# Altium footprint library 3.22-杂项.PcbLib: 199 footprints (part 13 of 15)
Each footprint in its own frame and in the unit in brackets; x right, y up, seen from the top. Pads: shape width x height; smd on the part's side, far side on the other; paste and mask are expansions set on the pad; w line width, h text height; cw(c..) or ccw(c..) is an arc to the next point about the centre after c.
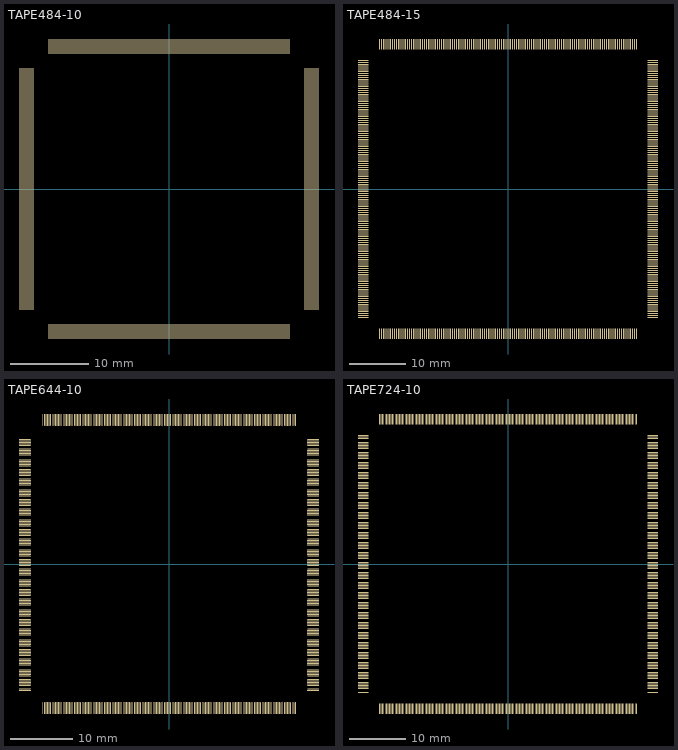
[diagram p12: the footprints below, top view; thin cyan lines are the x and y axes]

## TAPE484-10 [mil] "[ PCBѧϰȺ514746572 ]"
pads (484):
  oval 75x5 smd: 1(-712.5,599.5) 2(-712.5,589.5) 3(-712.5,579.5) 4(-712.5,569.5) 5(-712.5,559.5) 6(-712.5,549.5) 7(-712.5,539.5) 8(-712.5,529.5) 9(-712.5,519.5) 10(-712.5,509.5) 11(-712.5,499.5) 12(-712.5,489.5) 13(-712.5,479.5) 14(-712.5,469.5) 15(-712.5,459.5) 16(-712.5,449.5) 17(-712.5,439.5) 18(-712.5,429.5) 19(-712.5,419.5) 20(-712.5,409.5) 21(-712.5,399.5) 22(-712.5,389.5) 23(-712.5,379.5) 24(-712.5,369.5) 25(-712.5,359.5) 26(-712.5,349.5) 27(-712.5,339.5) 28(-712.5,329.5) 29(-712.5,319.5) 30(-712.5,309.5) 31(-712.5,299.5) 32(-712.5,289.5) 33(-712.5,279.5) 34(-712.5,269.5) 35(-712.5,259.5) 36(-712.5,249.5) 37(-712.5,239.5) 38(-712.5,229.5) 39(-712.5,219.5) 40(-712.5,209.5) 41(-712.5,199.5) 42(-712.5,189.5) 43(-712.5,179.5) 44(-712.5,169.5) 45(-712.5,159.5) 46(-712.5,149.5) 47(-712.5,139.5) 48(-712.5,129.5) 49(-712.5,119.5) 50(-712.5,109.5) 51(-712.5,99.5) 52(-712.5,89.5) 53(-712.5,79.5) 54(-712.5,69.5) 55(-712.5,59.5) 56(-712.5,49.5) 57(-712.5,39.5) 58(-712.5,29.5) 59(-712.5,19.5) 60(-712.5,9.5) 61(-712.5,-0.5) 62(-712.5,-10.5) 63(-712.5,-20.5) 64(-712.5,-30.5) 65(-712.5,-40.5) 66(-712.5,-50.5) 67(-712.5,-60.5) 68(-712.5,-70.5) 69(-712.5,-80.5) 70(-712.5,-90.5) 71(-712.5,-100.5) 72(-712.5,-110.5) 73(-712.5,-120.5) 74(-712.5,-130.5) 75(-712.5,-140.5) 76(-712.5,-150.5) 77(-712.5,-160.5) 78(-712.5,-170.5) 79(-712.5,-180.5) 80(-712.5,-190.5) 81(-712.5,-200.5) 82(-712.5,-210.5) 83(-712.5,-220.5) 84(-712.5,-230.5) 85(-712.5,-240.5) 86(-712.5,-250.5) 87(-712.5,-260.5) 88(-712.5,-270.5) 89(-712.5,-280.5) 90(-712.5,-290.5) 91(-712.5,-300.5) 92(-712.5,-310.5) 93(-712.5,-320.5) 94(-712.5,-330.5) 95(-712.5,-340.5) 96(-712.5,-350.5) 97(-712.5,-360.5) 98(-712.5,-370.5) 99(-712.5,-380.5) 100(-712.5,-390.5) 101(-712.5,-400.5) 102(-712.5,-410.5) 103(-712.5,-420.5) 104(-712.5,-430.5) 105(-712.5,-440.5) 106(-712.5,-450.5) 107(-712.5,-460.5) 108(-712.5,-470.5) 109(-712.5,-480.5) 110(-712.5,-490.5) 111(-712.5,-500.5) 112(-712.5,-510.5) 113(-712.5,-520.5) 114(-712.5,-530.5) 115(-712.5,-540.5) 116(-712.5,-550.5) 117(-712.5,-560.5) 118(-712.5,-570.5) 119(-712.5,-580.5) 120(-712.5,-590.5) 121(-712.5,-600.5) 243(712.5,-600.5) 244(712.5,-590.5) 245(712.5,-580.5) 246(712.5,-570.5) 247(712.5,-560.5) 248(712.5,-550.5) 249(712.5,-540.5) 250(712.5,-530.5) 251(712.5,-520.5) 252(712.5,-510.5) 253(712.5,-500.5) 254(712.5,-490.5) 255(712.5,-480.5) 256(712.5,-470.5) 257(712.5,-460.5) 258(712.5,-450.5) 259(712.5,-440.5) 260(712.5,-430.5) 261(712.5,-420.5) 262(712.5,-410.5) 263(712.5,-400.5) 264(712.5,-390.5) 265(712.5,-380.5) 266(712.5,-370.5) 267(712.5,-360.5) 268(712.5,-350.5) 269(712.5,-340.5) 270(712.5,-330.5) 271(712.5,-320.5) 272(712.5,-310.5) 273(712.5,-300.5) 274(712.5,-290.5) 275(712.5,-280.5) 276(712.5,-270.5) 277(712.5,-260.5) 278(712.5,-250.5) 279(712.5,-240.5) 280(712.5,-230.5) 281(712.5,-220.5) 282(712.5,-210.5) 283(712.5,-200.5) 284(712.5,-190.5) 285(712.5,-180.5) 286(712.5,-170.5) 287(712.5,-160.5) 288(712.5,-150.5) 289(712.5,-140.5) 290(712.5,-130.5) 291(712.5,-120.5) 292(712.5,-110.5) 293(712.5,-100.5) 294(712.5,-90.5) 295(712.5,-80.5) 296(712.5,-70.5) 297(712.5,-60.5) 298(712.5,-50.5) 299(712.5,-40.5) 300(712.5,-30.5) 301(712.5,-20.5) 302(712.5,-10.5) 303(712.5,-0.5) 304(712.5,9.5) 305(712.5,19.5) 306(712.5,29.5) 307(712.5,39.5) 308(712.5,49.5) 309(712.5,59.5) 310(712.5,69.5) 311(712.5,79.5) 312(712.5,89.5) 313(712.5,99.5) 314(712.5,109.5) 315(712.5,119.5) 316(712.5,129.5) 317(712.5,139.5) 318(712.5,149.5) 319(712.5,159.5) 320(712.5,169.5) 321(712.5,179.5) 322(712.5,189.5) 323(712.5,199.5) 324(712.5,209.5) 325(712.5,219.5) 326(712.5,229.5) 327(712.5,239.5) 328(712.5,249.5) 329(712.5,259.5) 330(712.5,269.5) 331(712.5,279.5) 332(712.5,289.5) 333(712.5,299.5) 334(712.5,309.5) 335(712.5,319.5) 336(712.5,329.5) 337(712.5,339.5) 338(712.5,349.5) 339(712.5,359.5) 340(712.5,369.5) 341(712.5,379.5) 342(712.5,389.5) 343(712.5,399.5) 344(712.5,409.5) 345(712.5,419.5) 346(712.5,429.5) 347(712.5,439.5) 348(712.5,449.5) 349(712.5,459.5) 350(712.5,469.5) 351(712.5,479.5) 352(712.5,489.5) 353(712.5,499.5) 354(712.5,509.5) 355(712.5,519.5) 356(712.5,529.5) 357(712.5,539.5) 358(712.5,549.5) 359(712.5,559.5) 360(712.5,569.5) 361(712.5,579.5) 362(712.5,589.5) 363(712.5,599.5)
  oval 5x75 smd: 122(-599.5,-712.5) 123(-589.5,-712.5) 124(-579.5,-712.5) 125(-569.5,-712.5) 126(-559.5,-712.5) 127(-549.5,-712.5) 128(-539.5,-712.5) 129(-529.5,-712.5) 130(-519.5,-712.5) 131(-509.5,-712.5) 132(-499.5,-712.5) 133(-489.5,-712.5) 134(-479.5,-712.5) 135(-469.5,-712.5) 136(-459.5,-712.5) 137(-449.5,-712.5) 138(-439.5,-712.5) 139(-429.5,-712.5) 140(-419.5,-712.5) 141(-409.5,-712.5) 142(-399.5,-712.5) 143(-389.5,-712.5) 144(-379.5,-712.5) 145(-369.5,-712.5) 146(-359.5,-712.5) 147(-349.5,-712.5) 148(-339.5,-712.5) 149(-329.5,-712.5) 150(-319.5,-712.5) 151(-309.5,-712.5) 152(-299.5,-712.5) 153(-289.5,-712.5) 154(-279.5,-712.5) 155(-269.5,-712.5) 156(-259.5,-712.5) 157(-249.5,-712.5) 158(-239.5,-712.5) 159(-229.5,-712.5) 160(-219.5,-712.5) 161(-209.5,-712.5) 162(-199.5,-712.5) 163(-189.5,-712.5) 164(-179.5,-712.5) 165(-169.5,-712.5) 166(-159.5,-712.5) 167(-149.5,-712.5) 168(-139.5,-712.5) 169(-129.5,-712.5) 170(-119.5,-712.5) 171(-109.5,-712.5) 172(-99.5,-712.5) 173(-89.5,-712.5) 174(-79.5,-712.5) 175(-69.5,-712.5) 176(-59.5,-712.5) 177(-49.5,-712.5) 178(-39.5,-712.5) 179(-29.5,-712.5) 180(-19.5,-712.5) 181(-9.5,-712.5) 182(0.5,-712.5) 183(10.5,-712.5) 184(20.5,-712.5) 185(30.5,-712.5) 186(40.5,-712.5) 187(50.5,-712.5) 188(60.5,-712.5) 189(70.5,-712.5) 190(80.5,-712.5) 191(90.5,-712.5) 192(100.5,-712.5) 193(110.5,-712.5) 194(120.5,-712.5) 195(130.5,-712.5) 196(140.5,-712.5) 197(150.5,-712.5) 198(160.5,-712.5) 199(170.5,-712.5) 200(180.5,-712.5) 201(190.5,-712.5) 202(200.5,-712.5) 203(210.5,-712.5) 204(220.5,-712.5) 205(230.5,-712.5) 206(240.5,-712.5) 207(250.5,-712.5) 208(260.5,-712.5) 209(270.5,-712.5) 210(280.5,-712.5) 211(290.5,-712.5) 212(300.5,-712.5) 213(310.5,-712.5) 214(320.5,-712.5) 215(330.5,-712.5) 216(340.5,-712.5) 217(350.5,-712.5) 218(360.5,-712.5) 219(370.5,-712.5) 220(380.5,-712.5) 221(390.5,-712.5) 222(400.5,-712.5) 223(410.5,-712.5) 224(420.5,-712.5) 225(430.5,-712.5) 226(440.5,-712.5) 227(450.5,-712.5) 228(460.5,-712.5) 229(470.5,-712.5) 230(480.5,-712.5) 231(490.5,-712.5) 232(500.5,-712.5) 233(510.5,-712.5) 234(520.5,-712.5) 235(530.5,-712.5) 236(540.5,-712.5) 237(550.5,-712.5) 238(560.5,-712.5) 239(570.5,-712.5) 240(580.5,-712.5) 241(590.5,-712.5) 242(600.5,-712.5) 364(600.5,712.5) 365(590.5,712.5) 366(580.5,712.5) 367(570.5,712.5) 368(560.5,712.5) 369(550.5,712.5) 370(540.5,712.5) 371(530.5,712.5) 372(520.5,712.5) 373(510.5,712.5) 374(500.5,712.5) 375(490.5,712.5) 376(480.5,712.5) 377(470.5,712.5) 378(460.5,712.5) 379(450.5,712.5) 380(440.5,712.5) 381(430.5,712.5) 382(420.5,712.5) 383(410.5,712.5) 384(400.5,712.5) 385(390.5,712.5) 386(380.5,712.5) 387(370.5,712.5) 388(360.5,712.5) 389(350.5,712.5) 390(340.5,712.5) 391(330.5,712.5) 392(320.5,712.5) 393(310.5,712.5) 394(300.5,712.5) 395(290.5,712.5) 396(280.5,712.5) 397(270.5,712.5) 398(260.5,712.5) 399(250.5,712.5) 400(240.5,712.5) 401(230.5,712.5) 402(220.5,712.5) 403(210.5,712.5) 404(200.5,712.5) 405(190.5,712.5) 406(180.5,712.5) 407(170.5,712.5) 408(160.5,712.5) 409(150.5,712.5) 410(140.5,712.5) 411(130.5,712.5) 412(120.5,712.5) 413(110.5,712.5) 414(100.5,712.5) 415(90.5,712.5) 416(80.5,712.5) 417(70.5,712.5) 418(60.5,712.5) 419(50.5,712.5) 420(40.5,712.5) 421(30.5,712.5) 422(20.5,712.5) 423(10.5,712.5) 424(0.5,712.5) 425(-9.5,712.5) 426(-19.5,712.5) 427(-29.5,712.5) 428(-39.5,712.5) 429(-49.5,712.5) 430(-59.5,712.5) 431(-69.5,712.5) 432(-79.5,712.5) 433(-89.5,712.5) 434(-99.5,712.5) 435(-109.5,712.5) 436(-119.5,712.5) 437(-129.5,712.5) 438(-139.5,712.5) 439(-149.5,712.5) 440(-159.5,712.5) 441(-169.5,712.5) 442(-179.5,712.5) 443(-189.5,712.5) 444(-199.5,712.5) 445(-209.5,712.5) 446(-219.5,712.5) 447(-229.5,712.5) 448(-239.5,712.5) 449(-249.5,712.5) 450(-259.5,712.5) 451(-269.5,712.5) 452(-279.5,712.5) 453(-289.5,712.5) 454(-299.5,712.5) 455(-309.5,712.5) 456(-319.5,712.5) 457(-329.5,712.5) 458(-339.5,712.5) 459(-349.5,712.5) 460(-359.5,712.5) 461(-369.5,712.5) 462(-379.5,712.5) 463(-389.5,712.5) 464(-399.5,712.5) 465(-409.5,712.5) 466(-419.5,712.5) 467(-429.5,712.5) 468(-439.5,712.5) 469(-449.5,712.5) 470(-459.5,712.5) 471(-469.5,712.5) 472(-479.5,712.5) 473(-489.5,712.5) 474(-499.5,712.5) 475(-509.5,712.5) 476(-519.5,712.5) 477(-529.5,712.5) 478(-539.5,712.5) 479(-549.5,712.5) 480(-559.5,712.5) 481(-569.5,712.5) 482(-579.5,712.5) 483(-589.5,712.5) 484(-599.5,712.5)

## TAPE484-15 [mil] "[ PCBѧϰȺ514746572 ]"
pads (484):
  oval 75x8 smd: 1(-1012.5,899.5) 2(-1012.5,884.5) 3(-1012.5,869.5) 4(-1012.5,854.5) 5(-1012.5,839.5) 6(-1012.5,824.5) 7(-1012.5,809.5) 8(-1012.5,794.5) 9(-1012.5,779.5) 10(-1012.5,764.5) 11(-1012.5,749.5) 12(-1012.5,734.5) 13(-1012.5,719.5) 14(-1012.5,704.5) 15(-1012.5,689.5) 16(-1012.5,674.5) 17(-1012.5,659.5) 18(-1012.5,644.5) 19(-1012.5,629.5) 20(-1012.5,614.5) 21(-1012.5,599.5) 22(-1012.5,584.5) 23(-1012.5,569.5) 24(-1012.5,554.5) 25(-1012.5,539.5) 26(-1012.5,524.5) 27(-1012.5,509.5) 28(-1012.5,494.5) 29(-1012.5,479.5) 30(-1012.5,464.5) 31(-1012.5,449.5) 32(-1012.5,434.5) 33(-1012.5,419.5) 34(-1012.5,404.5) 35(-1012.5,389.5) 36(-1012.5,374.5) 37(-1012.5,359.5) 38(-1012.5,344.5) 39(-1012.5,329.5) 40(-1012.5,314.5) 41(-1012.5,299.5) 42(-1012.5,284.5) 43(-1012.5,269.5) 44(-1012.5,254.5) 45(-1012.5,239.5) 46(-1012.5,224.5) 47(-1012.5,209.5) 48(-1012.5,194.5) 49(-1012.5,179.5) 50(-1012.5,164.5) 51(-1012.5,149.5) 52(-1012.5,134.5) 53(-1012.5,119.5) 54(-1012.5,104.5) 55(-1012.5,89.5) 56(-1012.5,74.5) 57(-1012.5,59.5) 58(-1012.5,44.5) 59(-1012.5,29.5) 60(-1012.5,14.5) 61(-1012.5,-0.5) 62(-1012.5,-15.5) 63(-1012.5,-30.5) 64(-1012.5,-45.5) 65(-1012.5,-60.5) 66(-1012.5,-75.5) 67(-1012.5,-90.5) 68(-1012.5,-105.5) 69(-1012.5,-120.5) 70(-1012.5,-135.5) 71(-1012.5,-150.5) 72(-1012.5,-165.5) 73(-1012.5,-180.5) 74(-1012.5,-195.5) 75(-1012.5,-210.5) 76(-1012.5,-225.5) 77(-1012.5,-240.5) 78(-1012.5,-255.5) 79(-1012.5,-270.5) 80(-1012.5,-285.5) 81(-1012.5,-300.5) 82(-1012.5,-315.5) 83(-1012.5,-330.5) 84(-1012.5,-345.5) 85(-1012.5,-360.5) 86(-1012.5,-375.5) 87(-1012.5,-390.5) 88(-1012.5,-405.5) 89(-1012.5,-420.5) 90(-1012.5,-435.5) 91(-1012.5,-450.5) 92(-1012.5,-465.5) 93(-1012.5,-480.5) 94(-1012.5,-495.5) 95(-1012.5,-510.5) 96(-1012.5,-525.5) 97(-1012.5,-540.5) 98(-1012.5,-555.5) 99(-1012.5,-570.5) 100(-1012.5,-585.5) 101(-1012.5,-600.5) 102(-1012.5,-615.5) 103(-1012.5,-630.5) 104(-1012.5,-645.5) 105(-1012.5,-660.5) 106(-1012.5,-675.5) 107(-1012.5,-690.5) 108(-1012.5,-705.5) 109(-1012.5,-720.5) 110(-1012.5,-735.5) 111(-1012.5,-750.5) 112(-1012.5,-765.5) 113(-1012.5,-780.5) 114(-1012.5,-795.5) 115(-1012.5,-810.5) 116(-1012.5,-825.5) 117(-1012.5,-840.5) 118(-1012.5,-855.5) 119(-1012.5,-870.5) 120(-1012.5,-885.5) 121(-1012.5,-900.5) 243(1012.5,-900.5) 244(1012.5,-885.5) 245(1012.5,-870.5) 246(1012.5,-855.5) 247(1012.5,-840.5) 248(1012.5,-825.5) 249(1012.5,-810.5) 250(1012.5,-795.5) 251(1012.5,-780.5) 252(1012.5,-765.5) 253(1012.5,-750.5) 254(1012.5,-735.5) 255(1012.5,-720.5) 256(1012.5,-705.5) 257(1012.5,-690.5) 258(1012.5,-675.5) 259(1012.5,-660.5) 260(1012.5,-645.5) 261(1012.5,-630.5) 262(1012.5,-615.5) 263(1012.5,-600.5) 264(1012.5,-585.5) 265(1012.5,-570.5) 266(1012.5,-555.5) 267(1012.5,-540.5) 268(1012.5,-525.5) 269(1012.5,-510.5) 270(1012.5,-495.5) 271(1012.5,-480.5) 272(1012.5,-465.5) 273(1012.5,-450.5) 274(1012.5,-435.5) 275(1012.5,-420.5) 276(1012.5,-405.5) 277(1012.5,-390.5) 278(1012.5,-375.5) 279(1012.5,-360.5) 280(1012.5,-345.5) 281(1012.5,-330.5) 282(1012.5,-315.5) 283(1012.5,-300.5) 284(1012.5,-285.5) 285(1012.5,-270.5) 286(1012.5,-255.5) 287(1012.5,-240.5) 288(1012.5,-225.5) 289(1012.5,-210.5) 290(1012.5,-195.5) 291(1012.5,-180.5) 292(1012.5,-165.5) 293(1012.5,-150.5) 294(1012.5,-135.5) 295(1012.5,-120.5) 296(1012.5,-105.5) 297(1012.5,-90.5) 298(1012.5,-75.5) 299(1012.5,-60.5) 300(1012.5,-45.5) 301(1012.5,-30.5) 302(1012.5,-15.5) 303(1012.5,-0.5) 304(1012.5,14.5) 305(1012.5,29.5) 306(1012.5,44.5) 307(1012.5,59.5) 308(1012.5,74.5) 309(1012.5,89.5) 310(1012.5,104.5) 311(1012.5,119.5) 312(1012.5,134.5) 313(1012.5,149.5) 314(1012.5,164.5) 315(1012.5,179.5) 316(1012.5,194.5) 317(1012.5,209.5) 318(1012.5,224.5) 319(1012.5,239.5) 320(1012.5,254.5) 321(1012.5,269.5) 322(1012.5,284.5) 323(1012.5,299.5) 324(1012.5,314.5) 325(1012.5,329.5) 326(1012.5,344.5) 327(1012.5,359.5) 328(1012.5,374.5) 329(1012.5,389.5) 330(1012.5,404.5) 331(1012.5,419.5) 332(1012.5,434.5) 333(1012.5,449.5) 334(1012.5,464.5) 335(1012.5,479.5) 336(1012.5,494.5) 337(1012.5,509.5) 338(1012.5,524.5) 339(1012.5,539.5) 340(1012.5,554.5) 341(1012.5,569.5) 342(1012.5,584.5) 343(1012.5,599.5) 344(1012.5,614.5) 345(1012.5,629.5) 346(1012.5,644.5) 347(1012.5,659.5) 348(1012.5,674.5) 349(1012.5,689.5) 350(1012.5,704.5) 351(1012.5,719.5) 352(1012.5,734.5) 353(1012.5,749.5) 354(1012.5,764.5) 355(1012.5,779.5) 356(1012.5,794.5) 357(1012.5,809.5) 358(1012.5,824.5) 359(1012.5,839.5) 360(1012.5,854.5) 361(1012.5,869.5) 362(1012.5,884.5) 363(1012.5,899.5)
  oval 8x75 smd: 122(-899.5,-1012.5) 123(-884.5,-1012.5) 124(-869.5,-1012.5) 125(-854.5,-1012.5) 126(-839.5,-1012.5) 127(-824.5,-1012.5) 128(-809.5,-1012.5) 129(-794.5,-1012.5) 130(-779.5,-1012.5) 131(-764.5,-1012.5) 132(-749.5,-1012.5) 133(-734.5,-1012.5) 134(-719.5,-1012.5) 135(-704.5,-1012.5) 136(-689.5,-1012.5) 137(-674.5,-1012.5) 138(-659.5,-1012.5) 139(-644.5,-1012.5) 140(-629.5,-1012.5) 141(-614.5,-1012.5) 142(-599.5,-1012.5) 143(-584.5,-1012.5) 144(-569.5,-1012.5) 145(-554.5,-1012.5) 146(-539.5,-1012.5) 147(-524.5,-1012.5) 148(-509.5,-1012.5) 149(-494.5,-1012.5) 150(-479.5,-1012.5) 151(-464.5,-1012.5) 152(-449.5,-1012.5) 153(-434.5,-1012.5) 154(-419.5,-1012.5) 155(-404.5,-1012.5) 156(-389.5,-1012.5) 157(-374.5,-1012.5) 158(-359.5,-1012.5) 159(-344.5,-1012.5) 160(-329.5,-1012.5) 161(-314.5,-1012.5) 162(-299.5,-1012.5) 163(-284.5,-1012.5) 164(-269.5,-1012.5) 165(-254.5,-1012.5) 166(-239.5,-1012.5) 167(-224.5,-1012.5) 168(-209.5,-1012.5) 169(-194.5,-1012.5) 170(-179.5,-1012.5) 171(-164.5,-1012.5) 172(-149.5,-1012.5) 173(-134.5,-1012.5) 174(-119.5,-1012.5) 175(-104.5,-1012.5) 176(-89.5,-1012.5) 177(-74.5,-1012.5) 178(-59.5,-1012.5) 179(-44.5,-1012.5) 180(-29.5,-1012.5) 181(-14.5,-1012.5) 182(0.5,-1012.5) 183(15.5,-1012.5) 184(30.5,-1012.5) 185(45.5,-1012.5) 186(60.5,-1012.5) 187(75.5,-1012.5) 188(90.5,-1012.5) 189(105.5,-1012.5) 190(120.5,-1012.5) 191(135.5,-1012.5) 192(150.5,-1012.5) 193(165.5,-1012.5) 194(180.5,-1012.5) 195(195.5,-1012.5) 196(210.5,-1012.5) 197(225.5,-1012.5) 198(240.5,-1012.5) 199(255.5,-1012.5) 200(270.5,-1012.5) 201(285.5,-1012.5) 202(300.5,-1012.5) 203(315.5,-1012.5) 204(330.5,-1012.5) 205(345.5,-1012.5) 206(360.5,-1012.5) 207(375.5,-1012.5) 208(390.5,-1012.5) 209(405.5,-1012.5) 210(420.5,-1012.5) 211(435.5,-1012.5) 212(450.5,-1012.5) 213(465.5,-1012.5) 214(480.5,-1012.5) 215(495.5,-1012.5) 216(510.5,-1012.5) 217(525.5,-1012.5) 218(540.5,-1012.5) 219(555.5,-1012.5) 220(570.5,-1012.5) 221(585.5,-1012.5) 222(600.5,-1012.5) 223(615.5,-1012.5) 224(630.5,-1012.5) 225(645.5,-1012.5) 226(660.5,-1012.5) 227(675.5,-1012.5) 228(690.5,-1012.5) 229(705.5,-1012.5) 230(720.5,-1012.5) 231(735.5,-1012.5) 232(750.5,-1012.5) 233(765.5,-1012.5) 234(780.5,-1012.5) 235(795.5,-1012.5) 236(810.5,-1012.5) 237(825.5,-1012.5) 238(840.5,-1012.5) 239(855.5,-1012.5) 240(870.5,-1012.5) 241(885.5,-1012.5) 242(900.5,-1012.5) 364(900.5,1012.5) 365(885.5,1012.5) 366(870.5,1012.5) 367(855.5,1012.5) 368(840.5,1012.5) 369(825.5,1012.5) 370(810.5,1012.5) 371(795.5,1012.5) 372(780.5,1012.5) 373(765.5,1012.5) 374(750.5,1012.5) 375(735.5,1012.5) 376(720.5,1012.5) 377(705.5,1012.5) 378(690.5,1012.5) 379(675.5,1012.5) 380(660.5,1012.5) 381(645.5,1012.5) 382(630.5,1012.5) 383(615.5,1012.5) 384(600.5,1012.5) 385(585.5,1012.5) 386(570.5,1012.5) 387(555.5,1012.5) 388(540.5,1012.5) 389(525.5,1012.5) 390(510.5,1012.5) 391(495.5,1012.5) 392(480.5,1012.5) 393(465.5,1012.5) 394(450.5,1012.5) 395(435.5,1012.5) 396(420.5,1012.5) 397(405.5,1012.5) 398(390.5,1012.5) 399(375.5,1012.5) 400(360.5,1012.5) 401(345.5,1012.5) 402(330.5,1012.5) 403(315.5,1012.5) 404(300.5,1012.5) 405(285.5,1012.5) 406(270.5,1012.5) 407(255.5,1012.5) 408(240.5,1012.5) 409(225.5,1012.5) 410(210.5,1012.5) 411(195.5,1012.5) 412(180.5,1012.5) 413(165.5,1012.5) 414(150.5,1012.5) 415(135.5,1012.5) 416(120.5,1012.5) 417(105.5,1012.5) 418(90.5,1012.5) 419(75.5,1012.5) 420(60.5,1012.5) 421(45.5,1012.5) 422(30.5,1012.5) 423(15.5,1012.5) 424(0.5,1012.5) 425(-14.5,1012.5) 426(-29.5,1012.5) 427(-44.5,1012.5) 428(-59.5,1012.5) 429(-74.5,1012.5) 430(-89.5,1012.5) 431(-104.5,1012.5) 432(-119.5,1012.5) 433(-134.5,1012.5) 434(-149.5,1012.5) 435(-164.5,1012.5) 436(-179.5,1012.5) 437(-194.5,1012.5) 438(-209.5,1012.5) 439(-224.5,1012.5) 440(-239.5,1012.5) 441(-254.5,1012.5) 442(-269.5,1012.5) 443(-284.5,1012.5) 444(-299.5,1012.5) 445(-314.5,1012.5) 446(-329.5,1012.5) 447(-344.5,1012.5) 448(-359.5,1012.5) 449(-374.5,1012.5) 450(-389.5,1012.5) 451(-404.5,1012.5) 452(-419.5,1012.5) 453(-434.5,1012.5) 454(-449.5,1012.5) 455(-464.5,1012.5) 456(-479.5,1012.5) 457(-494.5,1012.5) 458(-509.5,1012.5) 459(-524.5,1012.5) 460(-539.5,1012.5) 461(-554.5,1012.5) 462(-569.5,1012.5) 463(-584.5,1012.5) 464(-599.5,1012.5) 465(-614.5,1012.5) 466(-629.5,1012.5) 467(-644.5,1012.5) 468(-659.5,1012.5) 469(-674.5,1012.5) 470(-689.5,1012.5) 471(-704.5,1012.5) 472(-719.5,1012.5) 473(-734.5,1012.5) 474(-749.5,1012.5) 475(-764.5,1012.5) 476(-779.5,1012.5) 477(-794.5,1012.5) 478(-809.5,1012.5) 479(-824.5,1012.5) 480(-839.5,1012.5) 481(-854.5,1012.5) 482(-869.5,1012.5) 483(-884.5,1012.5) 484(-899.5,1012.5)

## TAPE644-10 [mil] "[ PCBѧϰȺ514746572 ]"
pads (644):
  oval 75x5 smd: 1(-912.5,799.5) 2(-912.5,789.5) 3(-912.5,779.5) 4(-912.5,769.5) 5(-912.5,759.5) 6(-912.5,749.5) 7(-912.5,739.5) 8(-912.5,729.5) 9(-912.5,719.5) 10(-912.5,709.5) 11(-912.5,699.5) 12(-912.5,689.5) 13(-912.5,679.5) 14(-912.5,669.5) 15(-912.5,659.5) 16(-912.5,649.5) 17(-912.5,639.5) 18(-912.5,629.5) 19(-912.5,619.5) 20(-912.5,609.5) 21(-912.5,599.5) 22(-912.5,589.5) 23(-912.5,579.5) 24(-912.5,569.5) 25(-912.5,559.5) 26(-912.5,549.5) 27(-912.5,539.5) 28(-912.5,529.5) 29(-912.5,519.5) 30(-912.5,509.5) 31(-912.5,499.5) 32(-912.5,489.5) 33(-912.5,479.5) 34(-912.5,469.5) 35(-912.5,459.5) 36(-912.5,449.5) 37(-912.5,439.5) 38(-912.5,429.5) 39(-912.5,419.5) 40(-912.5,409.5) 41(-912.5,399.5) 42(-912.5,389.5) 43(-912.5,379.5) 44(-912.5,369.5) 45(-912.5,359.5) 46(-912.5,349.5) 47(-912.5,339.5) 48(-912.5,329.5) 49(-912.5,319.5) 50(-912.5,309.5) 51(-912.5,299.5) 52(-912.5,289.5) 53(-912.5,279.5) 54(-912.5,269.5) 55(-912.5,259.5) 56(-912.5,249.5) 57(-912.5,239.5) 58(-912.5,229.5) 59(-912.5,219.5) 60(-912.5,209.5) 61(-912.5,199.5) 62(-912.5,189.5) 63(-912.5,179.5) 64(-912.5,169.5) 65(-912.5,159.5) 66(-912.5,149.5) 67(-912.5,139.5) 68(-912.5,129.5) 69(-912.5,119.5) 70(-912.5,109.5) 71(-912.5,99.5) 72(-912.5,89.5) 73(-912.5,79.5) 74(-912.5,69.5) 75(-912.5,59.5) 76(-912.5,49.5) 77(-912.5,39.5) 78(-912.5,29.5) 79(-912.5,19.5) 80(-912.5,9.5) 81(-912.5,-0.5) 82(-912.5,-10.5) 83(-912.5,-20.5) 84(-912.5,-30.5) 85(-912.5,-40.5) 86(-912.5,-50.5) 87(-912.5,-60.5) 88(-912.5,-70.5) 89(-912.5,-80.5) 90(-912.5,-90.5) 91(-912.5,-100.5) 92(-912.5,-110.5) 93(-912.5,-120.5) 94(-912.5,-130.5) 95(-912.5,-140.5) 96(-912.5,-150.5) 97(-912.5,-160.5) 98(-912.5,-170.5) 99(-912.5,-180.5) 100(-912.5,-190.5) 101(-912.5,-200.5) 102(-912.5,-210.5) 103(-912.5,-220.5) 104(-912.5,-230.5) 105(-912.5,-240.5) 106(-912.5,-250.5) 107(-912.5,-260.5) 108(-912.5,-270.5) 109(-912.5,-280.5) 110(-912.5,-290.5) 111(-912.5,-300.5) 112(-912.5,-310.5) 113(-912.5,-320.5) 114(-912.5,-330.5) 115(-912.5,-340.5) 116(-912.5,-350.5) 117(-912.5,-360.5) 118(-912.5,-370.5) 119(-912.5,-380.5) 120(-912.5,-390.5) 121(-912.5,-400.5) 122(-912.5,-410.5) 123(-912.5,-420.5) 124(-912.5,-430.5) 125(-912.5,-440.5) 126(-912.5,-450.5) 127(-912.5,-460.5) 128(-912.5,-470.5) 129(-912.5,-480.5) 130(-912.5,-490.5) 131(-912.5,-500.5) 132(-912.5,-510.5) 133(-912.5,-520.5) 134(-912.5,-530.5) 135(-912.5,-540.5) 136(-912.5,-550.5) 137(-912.5,-560.5) 138(-912.5,-570.5) 139(-912.5,-580.5) 140(-912.5,-590.5) 141(-912.5,-600.5) 142(-912.5,-610.5) 143(-912.5,-620.5) 144(-912.5,-630.5) 145(-912.5,-640.5) 146(-912.5,-650.5) 147(-912.5,-660.5) 148(-912.5,-670.5) 149(-912.5,-680.5) 150(-912.5,-690.5) 151(-912.5,-700.5) 152(-912.5,-710.5) 153(-912.5,-720.5) 154(-912.5,-730.5) 155(-912.5,-740.5) 156(-912.5,-750.5) 157(-912.5,-760.5) 158(-912.5,-770.5) 159(-912.5,-780.5) 160(-912.5,-790.5) 161(-912.5,-800.5) 323(912.5,-800.5) 324(912.5,-790.5) 325(912.5,-780.5) 326(912.5,-770.5) 327(912.5,-760.5) 328(912.5,-750.5) 329(912.5,-740.5) 330(912.5,-730.5) 331(912.5,-720.5) 332(912.5,-710.5) 333(912.5,-700.5) 334(912.5,-690.5) 335(912.5,-680.5) 336(912.5,-670.5) 337(912.5,-660.5) 338(912.5,-650.5) 339(912.5,-640.5) 340(912.5,-630.5) 341(912.5,-620.5) 342(912.5,-610.5) 343(912.5,-600.5) 344(912.5,-590.5) 345(912.5,-580.5) 346(912.5,-570.5) 347(912.5,-560.5) 348(912.5,-550.5) 349(912.5,-540.5) 350(912.5,-530.5) 351(912.5,-520.5) 352(912.5,-510.5) 353(912.5,-500.5) 354(912.5,-490.5) 355(912.5,-480.5) 356(912.5,-470.5) 357(912.5,-460.5) 358(912.5,-450.5) 359(912.5,-440.5) 360(912.5,-430.5) 361(912.5,-420.5) 362(912.5,-410.5) 363(912.5,-400.5) 364(912.5,-390.5) 365(912.5,-380.5) 366(912.5,-370.5) 367(912.5,-360.5) 368(912.5,-350.5) 369(912.5,-340.5) 370(912.5,-330.5) 371(912.5,-320.5) 372(912.5,-310.5) 373(912.5,-300.5) 374(912.5,-290.5) 375(912.5,-280.5) 376(912.5,-270.5) 377(912.5,-260.5) 378(912.5,-250.5) 379(912.5,-240.5) 380(912.5,-230.5) 381(912.5,-220.5) 382(912.5,-210.5) 383(912.5,-200.5) 384(912.5,-190.5) 385(912.5,-180.5) 386(912.5,-170.5) 387(912.5,-160.5) 388(912.5,-150.5) 389(912.5,-140.5) 390(912.5,-130.5) 391(912.5,-120.5) 392(912.5,-110.5) 393(912.5,-100.5) 394(912.5,-90.5) 395(912.5,-80.5) 396(912.5,-70.5) 397(912.5,-60.5) 398(912.5,-50.5) 399(912.5,-40.5) 400(912.5,-30.5) 401(912.5,-20.5) 402(912.5,-10.5) 403(912.5,-0.5) 404(912.5,9.5) 405(912.5,19.5) 406(912.5,29.5) 407(912.5,39.5) 408(912.5,49.5) 409(912.5,59.5) 410(912.5,69.5) 411(912.5,79.5) 412(912.5,89.5) 413(912.5,99.5) 414(912.5,109.5) 415(912.5,119.5) 416(912.5,129.5) 417(912.5,139.5) 418(912.5,149.5) 419(912.5,159.5) 420(912.5,169.5) 421(912.5,179.5) 422(912.5,189.5) 423(912.5,199.5) 424(912.5,209.5) 425(912.5,219.5) 426(912.5,229.5) 427(912.5,239.5) 428(912.5,249.5) 429(912.5,259.5) 430(912.5,269.5) 431(912.5,279.5) 432(912.5,289.5) 433(912.5,299.5) 434(912.5,309.5) 435(912.5,319.5) 436(912.5,329.5) 437(912.5,339.5) 438(912.5,349.5) 439(912.5,359.5) 440(912.5,369.5) 441(912.5,379.5) 442(912.5,389.5) 443(912.5,399.5) 444(912.5,409.5) 445(912.5,419.5) 446(912.5,429.5) 447(912.5,439.5) 448(912.5,449.5) 449(912.5,459.5) 450(912.5,469.5) 451(912.5,479.5) 452(912.5,489.5) 453(912.5,499.5) 454(912.5,509.5) 455(912.5,519.5) 456(912.5,529.5) 457(912.5,539.5) 458(912.5,549.5) 459(912.5,559.5) 460(912.5,569.5) 461(912.5,579.5) 462(912.5,589.5) 463(912.5,599.5) 464(912.5,609.5) 465(912.5,619.5) 466(912.5,629.5) 467(912.5,639.5) 468(912.5,649.5) 469(912.5,659.5) 470(912.5,669.5) 471(912.5,679.5) 472(912.5,689.5) 473(912.5,699.5) 474(912.5,709.5) 475(912.5,719.5) 476(912.5,729.5) 477(912.5,739.5) 478(912.5,749.5) 479(912.5,759.5) 480(912.5,769.5) 481(912.5,779.5) 482(912.5,789.5) 483(912.5,799.5)
  oval 5x75 smd: 162(-799.5,-912.5) 163(-789.5,-912.5) 164(-779.5,-912.5) 165(-769.5,-912.5) 166(-759.5,-912.5) 167(-749.5,-912.5) 168(-739.5,-912.5) 169(-729.5,-912.5) 170(-719.5,-912.5) 171(-709.5,-912.5) 172(-699.5,-912.5) 173(-689.5,-912.5) 174(-679.5,-912.5) 175(-669.5,-912.5) 176(-659.5,-912.5) 177(-649.5,-912.5) 178(-639.5,-912.5) 179(-629.5,-912.5) 180(-619.5,-912.5) 181(-609.5,-912.5) 182(-599.5,-912.5) 183(-589.5,-912.5) 184(-579.5,-912.5) 185(-569.5,-912.5) 186(-559.5,-912.5) 187(-549.5,-912.5) 188(-539.5,-912.5) 189(-529.5,-912.5) 190(-519.5,-912.5) 191(-509.5,-912.5) 192(-499.5,-912.5) 193(-489.5,-912.5) 194(-479.5,-912.5) 195(-469.5,-912.5) 196(-459.5,-912.5) 197(-449.5,-912.5) 198(-439.5,-912.5) 199(-429.5,-912.5) 200(-419.5,-912.5) 201(-409.5,-912.5) 202(-399.5,-912.5) 203(-389.5,-912.5) 204(-379.5,-912.5) 205(-369.5,-912.5) 206(-359.5,-912.5) 207(-349.5,-912.5) 208(-339.5,-912.5) 209(-329.5,-912.5) 210(-319.5,-912.5) 211(-309.5,-912.5) 212(-299.5,-912.5) 213(-289.5,-912.5) 214(-279.5,-912.5) 215(-269.5,-912.5) 216(-259.5,-912.5) 217(-249.5,-912.5) 218(-239.5,-912.5) 219(-229.5,-912.5) 220(-219.5,-912.5) 221(-209.5,-912.5) 222(-199.5,-912.5) 223(-189.5,-912.5) 224(-179.5,-912.5) 225(-169.5,-912.5) 226(-159.5,-912.5) 227(-149.5,-912.5) 228(-139.5,-912.5) 229(-129.5,-912.5) 230(-119.5,-912.5) 231(-109.5,-912.5) 232(-99.5,-912.5) 233(-89.5,-912.5) 234(-79.5,-912.5) 235(-69.5,-912.5) 236(-59.5,-912.5) 237(-49.5,-912.5) 238(-39.5,-912.5) 239(-29.5,-912.5) 240(-19.5,-912.5) 241(-9.5,-912.5) 242(0.5,-912.5) 243(10.5,-912.5) 244(20.5,-912.5) 245(30.5,-912.5) 246(40.5,-912.5) 247(50.5,-912.5) 248(60.5,-912.5) 249(70.5,-912.5) 250(80.5,-912.5) 251(90.5,-912.5) 252(100.5,-912.5) 253(110.5,-912.5) 254(120.5,-912.5) 255(130.5,-912.5) 256(140.5,-912.5) 257(150.5,-912.5) 258(160.5,-912.5) 259(170.5,-912.5) 260(180.5,-912.5) 261(190.5,-912.5) 262(200.5,-912.5) 263(210.5,-912.5) 264(220.5,-912.5) 265(230.5,-912.5) 266(240.5,-912.5) 267(250.5,-912.5) 268(260.5,-912.5) 269(270.5,-912.5) 270(280.5,-912.5) 271(290.5,-912.5) 272(300.5,-912.5) 273(310.5,-912.5) 274(320.5,-912.5) 275(330.5,-912.5) 276(340.5,-912.5) 277(350.5,-912.5) 278(360.5,-912.5) 279(370.5,-912.5) 280(380.5,-912.5) 281(390.5,-912.5) 282(400.5,-912.5) 283(410.5,-912.5) 284(420.5,-912.5) 285(430.5,-912.5) 286(440.5,-912.5) 287(450.5,-912.5) 288(460.5,-912.5) 289(470.5,-912.5) 290(480.5,-912.5) 291(490.5,-912.5) 292(500.5,-912.5) 293(510.5,-912.5) 294(520.5,-912.5) 295(530.5,-912.5) 296(540.5,-912.5) 297(550.5,-912.5) 298(560.5,-912.5) 299(570.5,-912.5) 300(580.5,-912.5) 301(590.5,-912.5) 302(600.5,-912.5) 303(610.5,-912.5) 304(620.5,-912.5) 305(630.5,-912.5) 306(640.5,-912.5) 307(650.5,-912.5) 308(660.5,-912.5) 309(670.5,-912.5) 310(680.5,-912.5) 311(690.5,-912.5) 312(700.5,-912.5) 313(710.5,-912.5) 314(720.5,-912.5) 315(730.5,-912.5) 316(740.5,-912.5) 317(750.5,-912.5) 318(760.5,-912.5) 319(770.5,-912.5) 320(780.5,-912.5) 321(790.5,-912.5) 322(800.5,-912.5) 484(800.5,912.5) 485(790.5,912.5) 486(780.5,912.5) 487(770.5,912.5) 488(760.5,912.5) 489(750.5,912.5) 490(740.5,912.5) 491(730.5,912.5) 492(720.5,912.5) 493(710.5,912.5) 494(700.5,912.5) 495(690.5,912.5) 496(680.5,912.5) 497(670.5,912.5) 498(660.5,912.5) 499(650.5,912.5) 500(640.5,912.5) 501(630.5,912.5) 502(620.5,912.5) 503(610.5,912.5) 504(600.5,912.5) 505(590.5,912.5) 506(580.5,912.5) 507(570.5,912.5) 508(560.5,912.5) 509(550.5,912.5) 510(540.5,912.5) 511(530.5,912.5) 512(520.5,912.5) 513(510.5,912.5) 514(500.5,912.5) 515(490.5,912.5) 516(480.5,912.5) 517(470.5,912.5) 518(460.5,912.5) 519(450.5,912.5) 520(440.5,912.5) 521(430.5,912.5) 522(420.5,912.5) 523(410.5,912.5) 524(400.5,912.5) 525(390.5,912.5) 526(380.5,912.5) 527(370.5,912.5) 528(360.5,912.5) 529(350.5,912.5) 530(340.5,912.5) 531(330.5,912.5) 532(320.5,912.5) 533(310.5,912.5) 534(300.5,912.5) 535(290.5,912.5) 536(280.5,912.5) 537(270.5,912.5) 538(260.5,912.5) 539(250.5,912.5) 540(240.5,912.5) 541(230.5,912.5) 542(220.5,912.5) 543(210.5,912.5) 544(200.5,912.5) 545(190.5,912.5) 546(180.5,912.5) 547(170.5,912.5) 548(160.5,912.5) 549(150.5,912.5) 550(140.5,912.5) 551(130.5,912.5) 552(120.5,912.5) 553(110.5,912.5) 554(100.5,912.5) 555(90.5,912.5) 556(80.5,912.5) 557(70.5,912.5) 558(60.5,912.5) 559(50.5,912.5) 560(40.5,912.5) 561(30.5,912.5) 562(20.5,912.5) 563(10.5,912.5) 564(0.5,912.5) 565(-9.5,912.5) 566(-19.5,912.5) 567(-29.5,912.5) 568(-39.5,912.5) 569(-49.5,912.5) 570(-59.5,912.5) 571(-69.5,912.5) 572(-79.5,912.5) 573(-89.5,912.5) 574(-99.5,912.5) 575(-109.5,912.5) 576(-119.5,912.5) 577(-129.5,912.5) 578(-139.5,912.5) 579(-149.5,912.5) 580(-159.5,912.5) 581(-169.5,912.5) 582(-179.5,912.5) 583(-189.5,912.5) 584(-199.5,912.5) 585(-209.5,912.5) 586(-219.5,912.5) 587(-229.5,912.5) 588(-239.5,912.5) 589(-249.5,912.5) 590(-259.5,912.5) 591(-269.5,912.5) 592(-279.5,912.5) 593(-289.5,912.5) 594(-299.5,912.5) 595(-309.5,912.5) 596(-319.5,912.5) 597(-329.5,912.5) 598(-339.5,912.5) 599(-349.5,912.5) 600(-359.5,912.5) 601(-369.5,912.5) 602(-379.5,912.5) 603(-389.5,912.5) 604(-399.5,912.5) 605(-409.5,912.5) 606(-419.5,912.5) 607(-429.5,912.5) 608(-439.5,912.5) 609(-449.5,912.5) 610(-459.5,912.5) 611(-469.5,912.5) 612(-479.5,912.5) 613(-489.5,912.5) 614(-499.5,912.5) 615(-509.5,912.5) 616(-519.5,912.5) 617(-529.5,912.5) 618(-539.5,912.5) 619(-549.5,912.5) 620(-559.5,912.5) 621(-569.5,912.5) 622(-579.5,912.5) 623(-589.5,912.5) 624(-599.5,912.5) 625(-609.5,912.5) 626(-619.5,912.5) 627(-629.5,912.5) 628(-639.5,912.5) 629(-649.5,912.5) 630(-659.5,912.5) 631(-669.5,912.5) 632(-679.5,912.5) 633(-689.5,912.5) 634(-699.5,912.5) 635(-709.5,912.5) 636(-719.5,912.5) 637(-729.5,912.5) 638(-739.5,912.5) 639(-749.5,912.5) 640(-759.5,912.5) 641(-769.5,912.5) 642(-779.5,912.5) 643(-789.5,912.5) 644(-799.5,912.5)

## TAPE724-10 [mil] "[ PCBѧϰȺ514746572 ]"
pads (724):
  oval 75x5 smd: 1(-1012.5,899.5) 2(-1012.5,889.5) 3(-1012.5,879.5) 4(-1012.5,869.5) 5(-1012.5,859.5) 6(-1012.5,849.5) 7(-1012.5,839.5) 8(-1012.5,829.5) 9(-1012.5,819.5) 10(-1012.5,809.5) 11(-1012.5,799.5) 12(-1012.5,789.5) 13(-1012.5,779.5) 14(-1012.5,769.5) 15(-1012.5,759.5) 16(-1012.5,749.5) 17(-1012.5,739.5) 18(-1012.5,729.5) 19(-1012.5,719.5) 20(-1012.5,709.5) 21(-1012.5,699.5) 22(-1012.5,689.5) 23(-1012.5,679.5) 24(-1012.5,669.5) 25(-1012.5,659.5) 26(-1012.5,649.5) 27(-1012.5,639.5) 28(-1012.5,629.5) 29(-1012.5,619.5) 30(-1012.5,609.5) 31(-1012.5,599.5) 32(-1012.5,589.5) 33(-1012.5,579.5) 34(-1012.5,569.5) 35(-1012.5,559.5) 36(-1012.5,549.5) 37(-1012.5,539.5) 38(-1012.5,529.5) 39(-1012.5,519.5) 40(-1012.5,509.5) 41(-1012.5,499.5) 42(-1012.5,489.5) 43(-1012.5,479.5) 44(-1012.5,469.5) 45(-1012.5,459.5) 46(-1012.5,449.5) 47(-1012.5,439.5) 48(-1012.5,429.5) 49(-1012.5,419.5) 50(-1012.5,409.5) 51(-1012.5,399.5) 52(-1012.5,389.5) 53(-1012.5,379.5) 54(-1012.5,369.5) 55(-1012.5,359.5) 56(-1012.5,349.5) 57(-1012.5,339.5) 58(-1012.5,329.5) 59(-1012.5,319.5) 60(-1012.5,309.5) 61(-1012.5,299.5) 62(-1012.5,289.5) 63(-1012.5,279.5) 64(-1012.5,269.5) 65(-1012.5,259.5) 66(-1012.5,249.5) 67(-1012.5,239.5) 68(-1012.5,229.5) 69(-1012.5,219.5) 70(-1012.5,209.5) 71(-1012.5,199.5) 72(-1012.5,189.5) 73(-1012.5,179.5) 74(-1012.5,169.5) 75(-1012.5,159.5) 76(-1012.5,149.5) 77(-1012.5,139.5) 78(-1012.5,129.5) 79(-1012.5,119.5) 80(-1012.5,109.5) 81(-1012.5,99.5) 82(-1012.5,89.5) 83(-1012.5,79.5) 84(-1012.5,69.5) 85(-1012.5,59.5) 86(-1012.5,49.5) 87(-1012.5,39.5) 88(-1012.5,29.5) 89(-1012.5,19.5) 90(-1012.5,9.5) 91(-1012.5,-0.5) 92(-1012.5,-10.5) 93(-1012.5,-20.5) 94(-1012.5,-30.5) 95(-1012.5,-40.5) 96(-1012.5,-50.5) 97(-1012.5,-60.5) 98(-1012.5,-70.5) 99(-1012.5,-80.5) 100(-1012.5,-90.5) 101(-1012.5,-100.5) 102(-1012.5,-110.5) 103(-1012.5,-120.5) 104(-1012.5,-130.5) 105(-1012.5,-140.5) 106(-1012.5,-150.5) 107(-1012.5,-160.5) 108(-1012.5,-170.5) 109(-1012.5,-180.5) 110(-1012.5,-190.5) 111(-1012.5,-200.5) 112(-1012.5,-210.5) 113(-1012.5,-220.5) 114(-1012.5,-230.5) 115(-1012.5,-240.5) 116(-1012.5,-250.5) 117(-1012.5,-260.5) 118(-1012.5,-270.5) 119(-1012.5,-280.5) 120(-1012.5,-290.5) 121(-1012.5,-300.5) 122(-1012.5,-310.5) 123(-1012.5,-320.5) 124(-1012.5,-330.5) 125(-1012.5,-340.5) 126(-1012.5,-350.5) 127(-1012.5,-360.5) 128(-1012.5,-370.5) 129(-1012.5,-380.5) 130(-1012.5,-390.5) 131(-1012.5,-400.5) 132(-1012.5,-410.5) 133(-1012.5,-420.5) 134(-1012.5,-430.5) 135(-1012.5,-440.5) 136(-1012.5,-450.5) 137(-1012.5,-460.5) 138(-1012.5,-470.5) 139(-1012.5,-480.5) 140(-1012.5,-490.5) 141(-1012.5,-500.5) 142(-1012.5,-510.5) 143(-1012.5,-520.5) 144(-1012.5,-530.5) 145(-1012.5,-540.5) 146(-1012.5,-550.5) 147(-1012.5,-560.5) 148(-1012.5,-570.5) 149(-1012.5,-580.5) 150(-1012.5,-590.5) 151(-1012.5,-600.5) 152(-1012.5,-610.5) 153(-1012.5,-620.5) 154(-1012.5,-630.5) 155(-1012.5,-640.5) 156(-1012.5,-650.5) 157(-1012.5,-660.5) 158(-1012.5,-670.5) 159(-1012.5,-680.5) 160(-1012.5,-690.5) 161(-1012.5,-700.5) 162(-1012.5,-710.5) 163(-1012.5,-720.5) 164(-1012.5,-730.5) 165(-1012.5,-740.5) 166(-1012.5,-750.5) 167(-1012.5,-760.5) 168(-1012.5,-770.5) 169(-1012.5,-780.5) 170(-1012.5,-790.5) 171(-1012.5,-800.5) 172(-1012.5,-810.5) 173(-1012.5,-820.5) 174(-1012.5,-830.5) 175(-1012.5,-840.5) 176(-1012.5,-850.5) 177(-1012.5,-860.5) 178(-1012.5,-870.5) 179(-1012.5,-880.5) 180(-1012.5,-890.5) 181(-1012.5,-900.5) 363(1012.5,-900.5) 364(1012.5,-890.5) 365(1012.5,-880.5) 366(1012.5,-870.5) 367(1012.5,-860.5) 368(1012.5,-850.5) 369(1012.5,-840.5) 370(1012.5,-830.5) 371(1012.5,-820.5) 372(1012.5,-810.5) 373(1012.5,-800.5) 374(1012.5,-790.5) 375(1012.5,-780.5) 376(1012.5,-770.5) 377(1012.5,-760.5) 378(1012.5,-750.5) 379(1012.5,-740.5) 380(1012.5,-730.5) 381(1012.5,-720.5) 382(1012.5,-710.5) 383(1012.5,-700.5) 384(1012.5,-690.5) 385(1012.5,-680.5) 386(1012.5,-670.5) 387(1012.5,-660.5) 388(1012.5,-650.5) 389(1012.5,-640.5) 390(1012.5,-630.5) 391(1012.5,-620.5) 392(1012.5,-610.5) 393(1012.5,-600.5) 394(1012.5,-590.5) 395(1012.5,-580.5) 396(1012.5,-570.5) 397(1012.5,-560.5) 398(1012.5,-550.5) 399(1012.5,-540.5) 400(1012.5,-530.5) 401(1012.5,-520.5) 402(1012.5,-510.5) 403(1012.5,-500.5) 404(1012.5,-490.5) 405(1012.5,-480.5) 406(1012.5,-470.5) 407(1012.5,-460.5) 408(1012.5,-450.5) 409(1012.5,-440.5) 410(1012.5,-430.5) 411(1012.5,-420.5) 412(1012.5,-410.5) 413(1012.5,-400.5) 414(1012.5,-390.5) 415(1012.5,-380.5) 416(1012.5,-370.5) 417(1012.5,-360.5) 418(1012.5,-350.5) 419(1012.5,-340.5) 420(1012.5,-330.5) 421(1012.5,-320.5) 422(1012.5,-310.5) 423(1012.5,-300.5) 424(1012.5,-290.5) 425(1012.5,-280.5) 426(1012.5,-270.5) 427(1012.5,-260.5) 428(1012.5,-250.5) 429(1012.5,-240.5) 430(1012.5,-230.5) 431(1012.5,-220.5) 432(1012.5,-210.5) 433(1012.5,-200.5) 434(1012.5,-190.5) 435(1012.5,-180.5) 436(1012.5,-170.5) 437(1012.5,-160.5) 438(1012.5,-150.5) 439(1012.5,-140.5) 440(1012.5,-130.5) 441(1012.5,-120.5) 442(1012.5,-110.5) 443(1012.5,-100.5) 444(1012.5,-90.5) 445(1012.5,-80.5) 446(1012.5,-70.5) 447(1012.5,-60.5) 448(1012.5,-50.5) 449(1012.5,-40.5) 450(1012.5,-30.5) 451(1012.5,-20.5) 452(1012.5,-10.5) 453(1012.5,-0.5) 454(1012.5,9.5) 455(1012.5,19.5) 456(1012.5,29.5) 457(1012.5,39.5) 458(1012.5,49.5) 459(1012.5,59.5) 460(1012.5,69.5) 461(1012.5,79.5) 462(1012.5,89.5) 463(1012.5,99.5) 464(1012.5,109.5) 465(1012.5,119.5) 466(1012.5,129.5) 467(1012.5,139.5) 468(1012.5,149.5) 469(1012.5,159.5) 470(1012.5,169.5) 471(1012.5,179.5) 472(1012.5,189.5) 473(1012.5,199.5) 474(1012.5,209.5) 475(1012.5,219.5) 476(1012.5,229.5) 477(1012.5,239.5) 478(1012.5,249.5) 479(1012.5,259.5) 480(1012.5,269.5) 481(1012.5,279.5) 482(1012.5,289.5) 483(1012.5,299.5) 484(1012.5,309.5) 485(1012.5,319.5) 486(1012.5,329.5) 487(1012.5,339.5) 488(1012.5,349.5) 489(1012.5,359.5) 490(1012.5,369.5) 491(1012.5,379.5) 492(1012.5,389.5) 493(1012.5,399.5) 494(1012.5,409.5) 495(1012.5,419.5) 496(1012.5,429.5) 497(1012.5,439.5) 498(1012.5,449.5) 499(1012.5,459.5) 500(1012.5,469.5) 501(1012.5,479.5) 502(1012.5,489.5) 503(1012.5,499.5) 504(1012.5,509.5) 505(1012.5,519.5) 506(1012.5,529.5) 507(1012.5,539.5) 508(1012.5,549.5) 509(1012.5,559.5) 510(1012.5,569.5) 511(1012.5,579.5) 512(1012.5,589.5) 513(1012.5,599.5) 514(1012.5,609.5) 515(1012.5,619.5) 516(1012.5,629.5) 517(1012.5,639.5) 518(1012.5,649.5) 519(1012.5,659.5) 520(1012.5,669.5) 521(1012.5,679.5) 522(1012.5,689.5) 523(1012.5,699.5) 524(1012.5,709.5) 525(1012.5,719.5) 526(1012.5,729.5) 527(1012.5,739.5) 528(1012.5,749.5) 529(1012.5,759.5) 530(1012.5,769.5) 531(1012.5,779.5) 532(1012.5,789.5) 533(1012.5,799.5) 534(1012.5,809.5) 535(1012.5,819.5) 536(1012.5,829.5) 537(1012.5,839.5) 538(1012.5,849.5) 539(1012.5,859.5) 540(1012.5,869.5) 541(1012.5,879.5) 542(1012.5,889.5) 543(1012.5,899.5)
  oval 5x75 smd: 182(-899.5,-1012.5) 183(-889.5,-1012.5) 184(-879.5,-1012.5) 185(-869.5,-1012.5) 186(-859.5,-1012.5) 187(-849.5,-1012.5) 188(-839.5,-1012.5) 189(-829.5,-1012.5) 190(-819.5,-1012.5) 191(-809.5,-1012.5) 192(-799.5,-1012.5) 193(-789.5,-1012.5) 194(-779.5,-1012.5) 195(-769.5,-1012.5) 196(-759.5,-1012.5) 197(-749.5,-1012.5) 198(-739.5,-1012.5) 199(-729.5,-1012.5) 200(-719.5,-1012.5) 201(-709.5,-1012.5) 202(-699.5,-1012.5) 203(-689.5,-1012.5) 204(-679.5,-1012.5) 205(-669.5,-1012.5) 206(-659.5,-1012.5) 207(-649.5,-1012.5) 208(-639.5,-1012.5) 209(-629.5,-1012.5) 210(-619.5,-1012.5) 211(-609.5,-1012.5) 212(-599.5,-1012.5) 213(-589.5,-1012.5) 214(-579.5,-1012.5) 215(-569.5,-1012.5) 216(-559.5,-1012.5) 217(-549.5,-1012.5) 218(-539.5,-1012.5) 219(-529.5,-1012.5) 220(-519.5,-1012.5) 221(-509.5,-1012.5) 222(-499.5,-1012.5) 223(-489.5,-1012.5) 224(-479.5,-1012.5) 225(-469.5,-1012.5) 226(-459.5,-1012.5) 227(-449.5,-1012.5) 228(-439.5,-1012.5) 229(-429.5,-1012.5) 230(-419.5,-1012.5) 231(-409.5,-1012.5) 232(-399.5,-1012.5) 233(-389.5,-1012.5) 234(-379.5,-1012.5) 235(-369.5,-1012.5) 236(-359.5,-1012.5) 237(-349.5,-1012.5) 238(-339.5,-1012.5) 239(-329.5,-1012.5) 240(-319.5,-1012.5) 241(-309.5,-1012.5) 242(-299.5,-1012.5) 243(-289.5,-1012.5) 244(-279.5,-1012.5) 245(-269.5,-1012.5) 246(-259.5,-1012.5) 247(-249.5,-1012.5) 248(-239.5,-1012.5) 249(-229.5,-1012.5) 250(-219.5,-1012.5) 251(-209.5,-1012.5) 252(-199.5,-1012.5) 253(-189.5,-1012.5) 254(-179.5,-1012.5) 255(-169.5,-1012.5) 256(-159.5,-1012.5) 257(-149.5,-1012.5) 258(-139.5,-1012.5) 259(-129.5,-1012.5) 260(-119.5,-1012.5) 261(-109.5,-1012.5) 262(-99.5,-1012.5) 263(-89.5,-1012.5) 264(-79.5,-1012.5) 265(-69.5,-1012.5) 266(-59.5,-1012.5) 267(-49.5,-1012.5) 268(-39.5,-1012.5) 269(-29.5,-1012.5) 270(-19.5,-1012.5) 271(-9.5,-1012.5) 272(0.5,-1012.5) 273(10.5,-1012.5) 274(20.5,-1012.5) 275(30.5,-1012.5) 276(40.5,-1012.5) 277(50.5,-1012.5) 278(60.5,-1012.5) 279(70.5,-1012.5) 280(80.5,-1012.5) 281(90.5,-1012.5) 282(100.5,-1012.5) 283(110.5,-1012.5) 284(120.5,-1012.5) 285(130.5,-1012.5) 286(140.5,-1012.5) 287(150.5,-1012.5) 288(160.5,-1012.5) 289(170.5,-1012.5) 290(180.5,-1012.5) 291(190.5,-1012.5) 292(200.5,-1012.5) 293(210.5,-1012.5) 294(220.5,-1012.5) 295(230.5,-1012.5) 296(240.5,-1012.5) 297(250.5,-1012.5) 298(260.5,-1012.5) 299(270.5,-1012.5) 300(280.5,-1012.5) 301(290.5,-1012.5) 302(300.5,-1012.5) 303(310.5,-1012.5) 304(320.5,-1012.5) 305(330.5,-1012.5) 306(340.5,-1012.5) 307(350.5,-1012.5) 308(360.5,-1012.5) 309(370.5,-1012.5) 310(380.5,-1012.5) 311(390.5,-1012.5) 312(400.5,-1012.5) 313(410.5,-1012.5) 314(420.5,-1012.5) 315(430.5,-1012.5) 316(440.5,-1012.5) 317(450.5,-1012.5) 318(460.5,-1012.5) 319(470.5,-1012.5) 320(480.5,-1012.5) 321(490.5,-1012.5) 322(500.5,-1012.5) 323(510.5,-1012.5) 324(520.5,-1012.5) 325(530.5,-1012.5) 326(540.5,-1012.5) 327(550.5,-1012.5) 328(560.5,-1012.5) 329(570.5,-1012.5) 330(580.5,-1012.5) 331(590.5,-1012.5) 332(600.5,-1012.5) 333(610.5,-1012.5) 334(620.5,-1012.5) 335(630.5,-1012.5) 336(640.5,-1012.5) 337(650.5,-1012.5) 338(660.5,-1012.5) 339(670.5,-1012.5) 340(680.5,-1012.5) 341(690.5,-1012.5) 342(700.5,-1012.5) 343(710.5,-1012.5) 344(720.5,-1012.5) 345(730.5,-1012.5) 346(740.5,-1012.5) 347(750.5,-1012.5) 348(760.5,-1012.5) 349(770.5,-1012.5) 350(780.5,-1012.5) 351(790.5,-1012.5) 352(800.5,-1012.5) 353(810.5,-1012.5) 354(820.5,-1012.5) 355(830.5,-1012.5) 356(840.5,-1012.5) 357(850.5,-1012.5) 358(860.5,-1012.5) 359(870.5,-1012.5) 360(880.5,-1012.5) 361(890.5,-1012.5) 362(900.5,-1012.5) 544(900.5,1012.5) 545(890.5,1012.5) 546(880.5,1012.5) 547(870.5,1012.5) 548(860.5,1012.5) 549(850.5,1012.5) 550(840.5,1012.5) 551(830.5,1012.5) 552(820.5,1012.5) 553(810.5,1012.5) 554(800.5,1012.5) 555(790.5,1012.5) 556(780.5,1012.5) 557(770.5,1012.5) 558(760.5,1012.5) 559(750.5,1012.5) 560(740.5,1012.5) 561(730.5,1012.5) 562(720.5,1012.5) 563(710.5,1012.5) 564(700.5,1012.5) 565(690.5,1012.5) 566(680.5,1012.5) 567(670.5,1012.5) 568(660.5,1012.5) 569(650.5,1012.5) 570(640.5,1012.5) 571(630.5,1012.5) 572(620.5,1012.5) 573(610.5,1012.5) 574(600.5,1012.5) 575(590.5,1012.5) 576(580.5,1012.5) 577(570.5,1012.5) 578(560.5,1012.5) 579(550.5,1012.5) 580(540.5,1012.5) 581(530.5,1012.5) 582(520.5,1012.5) 583(510.5,1012.5) 584(500.5,1012.5) 585(490.5,1012.5) 586(480.5,1012.5) 587(470.5,1012.5) 588(460.5,1012.5) 589(450.5,1012.5) 590(440.5,1012.5) 591(430.5,1012.5) 592(420.5,1012.5) 593(410.5,1012.5) 594(400.5,1012.5) 595(390.5,1012.5) 596(380.5,1012.5) 597(370.5,1012.5) 598(360.5,1012.5) 599(350.5,1012.5) 600(340.5,1012.5) 601(330.5,1012.5) 602(320.5,1012.5) 603(310.5,1012.5) 604(300.5,1012.5) 605(290.5,1012.5) 606(280.5,1012.5) 607(270.5,1012.5) 608(260.5,1012.5) 609(250.5,1012.5) 610(240.5,1012.5) 611(230.5,1012.5) 612(220.5,1012.5) 613(210.5,1012.5) 614(200.5,1012.5) 615(190.5,1012.5) 616(180.5,1012.5) 617(170.5,1012.5) 618(160.5,1012.5) 619(150.5,1012.5) 620(140.5,1012.5) 621(130.5,1012.5) 622(120.5,1012.5) 623(110.5,1012.5) 624(100.5,1012.5) 625(90.5,1012.5) 626(80.5,1012.5) 627(70.5,1012.5) 628(60.5,1012.5) 629(50.5,1012.5) 630(40.5,1012.5) 631(30.5,1012.5) 632(20.5,1012.5) 633(10.5,1012.5) 634(0.5,1012.5) 635(-9.5,1012.5) 636(-19.5,1012.5) 637(-29.5,1012.5) 638(-39.5,1012.5) 639(-49.5,1012.5) 640(-59.5,1012.5) 641(-69.5,1012.5) 642(-79.5,1012.5) 643(-89.5,1012.5) 644(-99.5,1012.5) 645(-109.5,1012.5) 646(-119.5,1012.5) 647(-129.5,1012.5) 648(-139.5,1012.5) 649(-149.5,1012.5) 650(-159.5,1012.5) 651(-169.5,1012.5) 652(-179.5,1012.5) 653(-189.5,1012.5) 654(-199.5,1012.5) 655(-209.5,1012.5) 656(-219.5,1012.5) 657(-229.5,1012.5) 658(-239.5,1012.5) 659(-249.5,1012.5) 660(-259.5,1012.5) 661(-269.5,1012.5) 662(-279.5,1012.5) 663(-289.5,1012.5) 664(-299.5,1012.5) 665(-309.5,1012.5) 666(-319.5,1012.5) 667(-329.5,1012.5) 668(-339.5,1012.5) 669(-349.5,1012.5) 670(-359.5,1012.5) 671(-369.5,1012.5) 672(-379.5,1012.5) 673(-389.5,1012.5) 674(-399.5,1012.5) 675(-409.5,1012.5) 676(-419.5,1012.5) 677(-429.5,1012.5) 678(-439.5,1012.5) 679(-449.5,1012.5) 680(-459.5,1012.5) 681(-469.5,1012.5) 682(-479.5,1012.5) 683(-489.5,1012.5) 684(-499.5,1012.5) 685(-509.5,1012.5) 686(-519.5,1012.5) 687(-529.5,1012.5) 688(-539.5,1012.5) 689(-549.5,1012.5) 690(-559.5,1012.5) 691(-569.5,1012.5) 692(-579.5,1012.5) 693(-589.5,1012.5) 694(-599.5,1012.5) 695(-609.5,1012.5) 696(-619.5,1012.5) 697(-629.5,1012.5) 698(-639.5,1012.5) 699(-649.5,1012.5) 700(-659.5,1012.5) 701(-669.5,1012.5) 702(-679.5,1012.5) 703(-689.5,1012.5) 704(-699.5,1012.5) 705(-709.5,1012.5) 706(-719.5,1012.5) 707(-729.5,1012.5) 708(-739.5,1012.5) 709(-749.5,1012.5) 710(-759.5,1012.5) 711(-769.5,1012.5) 712(-779.5,1012.5) 713(-789.5,1012.5) 714(-799.5,1012.5) 715(-809.5,1012.5) 716(-819.5,1012.5) 717(-829.5,1012.5) 718(-839.5,1012.5) 719(-849.5,1012.5) 720(-859.5,1012.5) 721(-869.5,1012.5) 722(-879.5,1012.5) 723(-889.5,1012.5) 724(-899.5,1012.5)